# Altium footprint library En.PcbLib: 157 footprints (part 6 of 10)
Each footprint in its own frame and in the unit in brackets; x right, y up, seen from the top. Pads: shape width x height; smd on the part's side, far side on the other; paste and mask are expansions set on the pad; w line width, h text height; cw(c..) or ccw(c..) is an arc to the next point about the centre after c.
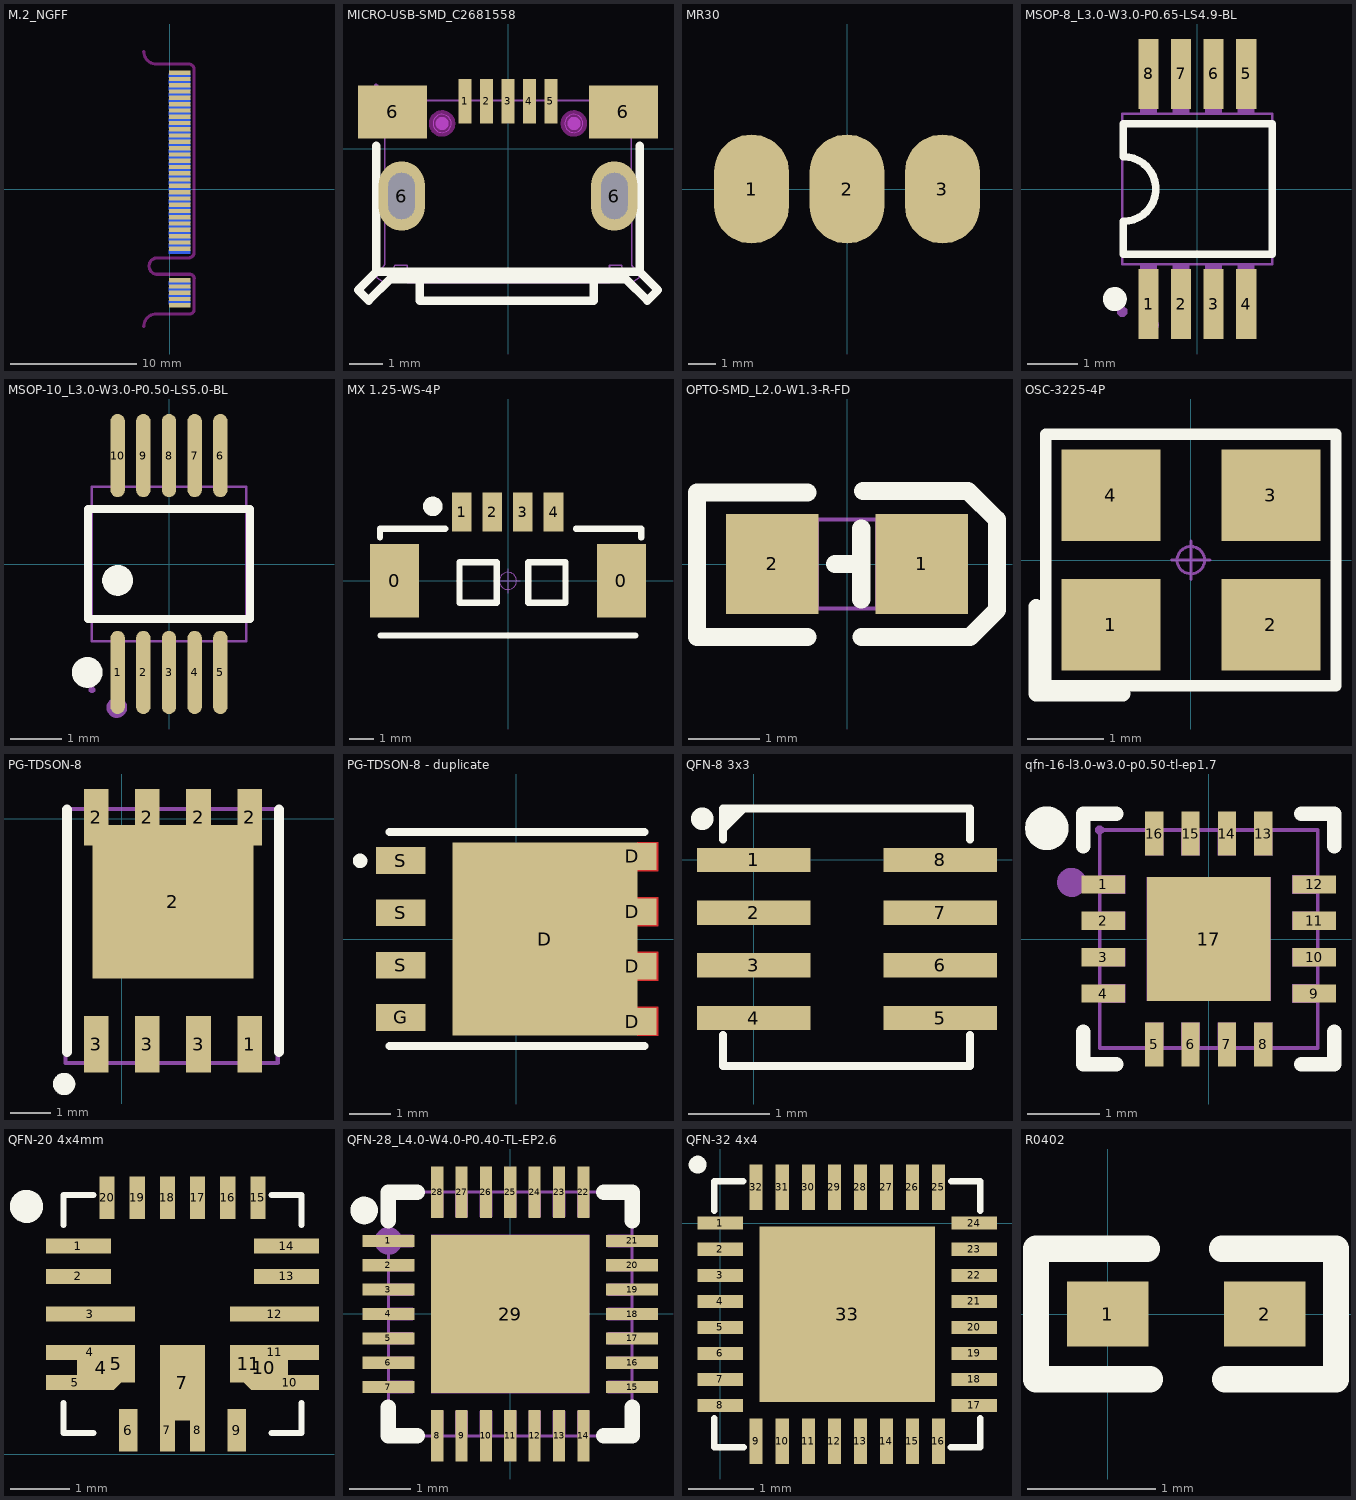
[diagram p5: the footprints below, top view; thin cyan lines are the x and y axes]

## M.2_NGFF [mm]
pads (67):
  rect 1.7x0.34 smd paste+0 mask+0.102: 1(0.787,9.25) 3(0.786,8.75) 5(0.786,8.249) 7(0.786,7.749) 9(0.786,7.249) 11(0.786,6.749) 13(0.786,6.249) 15(0.786,5.749) 17(0.786,5.249) 19(0.786,4.749) 21(0.786,4.249) 23(0.786,3.749) 25(0.786,3.249) 27(0.786,2.749) 29(0.786,2.249) 31(0.786,1.749) 33(0.786,1.249) 35(0.786,0.749) 37(0.786,0.249) 39(0.786,-0.251) 41(0.786,-0.751) 43(0.786,-1.251) 45(0.786,-1.751) 47(0.786,-2.251) 49(0.786,-2.751) 51(0.786,-3.251) 53(0.786,-3.751) 55(0.786,-4.251) 57(0.786,-4.751) 67(0.786,-7.251) 69(0.786,-7.751) 71(0.786,-8.251) 73(0.786,-8.751) 75(0.786,-9.251)
  rect 1.7x0.34 smd far side paste+0 mask+0.102: 2(0.787,9) 4(0.786,8.501) 6(0.786,8.001) 8(0.786,7.501) 10(0.786,7.001) 12(0.786,6.501) 14(0.786,6.001) 16(0.786,5.501) 18(0.786,5.001) 20(0.786,4.499) 22(0.786,4.001) 24(0.786,3.501) 26(0.786,3.001) 28(0.786,2.501) 30(0.786,2.001) 32(0.786,1.501) 34(0.786,1.001) 36(0.786,0.501) 38(0.786,0.001) 40(0.786,-0.499) 42(0.786,-0.998) 44(0.786,-1.499) 46(0.786,-1.999) 48(0.786,-2.499) 50(0.786,-2.999) 52(0.786,-3.499) 54(0.786,-3.999) 56(0.786,-4.499) 58(0.786,-4.999) 68(0.786,-7.499) 70(0.786,-7.999) 72(0.786,-8.499) 74(0.786,-8.999)
Keep-Out Layer:
  lines w0.254: -2.063,-10.93 cw(c-1.063,-10.93) -1.063,-9.93 1.574,-9.935 ccw(c1.589,-9.595) 1.927,-9.555 ; -2.063,10.93 ccw(c-1.063,10.93) -1.063,9.93 1.549,9.94 ; 1.523,9.94 cw(c1.502,9.513) 1.93,9.508 ; 1.584,-6.78 cw(c1.598,-7.12) 1.936,-7.16 1.93,-9.567 ; 1.599,-6.773 -0.963,-6.78 cw(c-0.995,-6.13) -0.963,-5.48 1.523,-5.478 ccw(c1.502,-5.051) 1.93,-5.046 1.93,9.559

## MICRO-USB-SMD_C2681558 [mm]
pads (9):
  rect 0.4x1.35 smd paste-100 mask+0.051: 1(-1.3,1.438) 2(-0.65,1.438) 3(0,1.438) 4(0.65,1.438) 5(1.3,1.438)
  rect 2.1x1.6 smd paste-100 mask+0.051: 6(-3.5,1.113) 6(3.5,1.113)
  oval 1.4x2.1 hole 0.8 slot 1.4 at 90 deg: 6(-3.225,-1.438) 6(3.225,-1.438)
Top Overlay:
  lines w0.254: -4,0.081 -4,-3.737 ; -2.675,-3.962 -2.675,-4.612 2.6,-4.612 2.6,-3.962 ; 4,0.081 4,-3.737 ; -4,-3.737 -4.55,-4.287 -4.225,-4.612 -3.575,-3.962 3.575,-3.962 4.225,-4.612 4.55,-4.287 4,-3.737 ; -4,-3.737 4,-3.737
Top Paste:
  drawing of 9 lines, arcs and shapes, not listed
Keep-Out Layer:
  board cut-out: -1.725,0.763 -1.725,0.817 -1.768,0.917 -1.845,0.994 -1.945,1.036 -2.054,1.036 -2.155,0.994 -2.232,0.918 -2.275,0.817 -2.275,0.763 -2.275,0.708 -2.232,0.608 -2.155,0.531 -2.055,0.49 -1.946,0.489 -1.845,0.531 -1.768,0.608 -1.725,0.708
  board cut-out: 2.275,0.763 2.275,0.817 2.232,0.917 2.155,0.994 2.055,1.036 1.946,1.036 1.845,0.994 1.768,0.918 1.725,0.817 1.725,0.763 1.725,0.708 1.768,0.608 1.845,0.531 1.945,0.49 2.054,0.489 2.155,0.531 2.232,0.608 2.275,0.708
Mechanical 1:
  circle w0.025: c-2,0.763 r0.275
  circle w0.025: c2,0.763 r0.275
Mechanical 6:
  circle w0.2: c-2,0.763 r0.1
  circle w0.2: c2,0.763 r0.1
Mechanical 15:
  region: -3.94,1.913 -3.94,1.937 -3.975,1.973 -4.025,1.973 -4.06,1.937 -4.06,1.913 -4.06,1.888 -4.025,1.853 -3.975,1.853 -3.94,1.888
  region: 1.175,1.913 1.425,1.913 1.425,0.963 1.175,0.963
  region: 0.525,1.913 0.775,1.913 0.775,0.963 0.525,0.963
  region: -0.125,1.913 0.125,1.913 0.125,0.963 -0.125,0.963
  region: -0.775,1.913 -0.525,1.913 -0.525,0.963 -0.775,0.963
  region: -1.425,1.913 -1.175,1.913 -1.175,0.963 -1.425,0.963
  region: 2.74,1.46 3.74,1.46 3.74,0.51 2.74,0.51
  region: -3.75,1.46 -2.75,1.46 -2.75,0.51 -3.75,0.51
  region: 3.45,-0.988 3.45,-1.888 3,-1.888 3,-0.988
  region: -3,-0.988 -3,-1.888 -3.45,-1.888 -3.45,-0.988
  lines w0.051: -4,-3.9 -3.75,-4.07 -3.48,-3.68 -3.44,-3.54 -3.06,-3.54 -3.06,-4.06 3.08,-4.06 3.08,-3.54 3.45,-3.54 3.47,-3.67 3.58,-3.82 3.75,-4.07 4,-3.9 3.75,-3.54 3.74,1.46 -3.74,1.46 -3.74,-3.52 -4,-3.9
Multi-Layer keep-out:
  circle w0.254: c-2,0.763 r0.275
  circle w0.254: c2,0.763 r0.275
3D body "micro 6.4jb.step": height 2.72, standoff -1.21, extent -4,-4.118 4,1.862

## MR30 [mm]
pads (3):
  oval 2.75x4 smd: 1(-3.5,0) 2(0,0) 3(3.5,0)
3D body "mr30-m.step": height 2.45, standoff -2.46, extent -5.95,-1.015 5.95,12.385

## MSOP-8_L3.0-W3.0-P0.65-LS4.9-BL [mil]
pads (8):
  rect 15.98x55 smd: 1(-38.39,-90.55) 2(-12.8,-90.55) 3(12.8,-90.55) 4(38.39,-90.55) 5(38.39,90.55) 6(12.8,90.55) 7(-12.8,90.55) 8(-38.39,90.55)
Top Overlay:
  circle w9.45: c-64.96,-86.61 r4.72
  lines w5.91: -58.2,-51.18 -58.2,-25.5 ccw(c-58.2,0) -58.2,25.5 -58.2,51.18 59.05,51.18 59.05,-51.18 -58.2,-51.18
Mechanical 6:
  circle w7.87: c-38.19,-107.09 r3.94
Mechanical 15:
  region: -55.11,-96.46 -55.11,-94.83 -57.42,-92.52 -60.68,-92.52 -62.99,-94.83 -62.99,-96.46 -62.99,-98.09 -60.68,-100.4 -57.42,-100.4 -55.11,-98.09
  region: 6.4,-71 19.19,-71 19.19,-96.46 6.4,-96.46
  region: 6.42,-58.66 6.42,-72.44 19.17,-72.44 19.17,-58.66
  region: 31.99,-71 44.78,-71 44.78,-96.46 31.99,-96.46
  region: 32.01,-58.66 32.01,-72.44 44.77,-72.44 44.77,-58.66
  region: -19.19,-71 -6.4,-71 -6.4,-96.46 -19.19,-96.46
  region: -19.17,-58.66 -19.17,-72.44 -6.42,-72.44 -6.42,-58.66
  region: -44.78,-71 -31.99,-71 -31.99,-96.46 -44.78,-96.46
  region: -44.76,-58.66 -44.76,-72.44 -32.01,-72.44 -32.01,-58.66
  region: 19.19,71 6.4,71 6.4,96.46 19.19,96.46
  region: 19.18,58.66 19.18,72.44 6.42,72.44 6.42,58.66
  region: 44.78,71 31.99,71 31.99,96.46 44.78,96.46
  region: 44.77,58.66 44.77,72.44 32.01,72.44 32.01,58.66
  region: -6.4,71 -19.2,71 -19.2,96.46 -6.4,96.46
  region: -6.42,58.66 -6.42,72.44 -19.17,72.44 -19.17,58.66
  region: -31.99,71 -44.78,71 -44.78,96.46 -31.99,96.46
  region: -32.01,58.66 -32.01,72.44 -44.76,72.44 -44.76,58.66
  lines w2: -59.05,-59.05 59.05,-59.05 59.05,59.05 -59.05,59.05 -59.05,-59.05
3D body "User Library-MSOP8.SLDPRT": height 42, standoff -1.31, extent -61.02,-97.2 61.02,97.2

## MSOP-10_L3.0-W3.0-P0.50-LS5.0-BL [mm]
pads (10):
  oval 0.28x1.62 smd: 1(-1,-2.11) 2(-0.5,-2.11) 3(0,-2.11) 4(0.5,-2.11) 5(1,-2.11) 6(1,2.11) 7(0.5,2.11) 8(0,2.11) 9(-0.5,2.11) 10(-1,2.11)
Top Overlay:
  circle w0.3: c-1.592,-2.11 r0.15
  circle w0.3: c-1,-0.319 r0.15
  lines w0.152: -1.576,-1.071 1.576,-1.071 1.576,1.071 -1.576,1.071 -1.576,-1.071
Mechanical 6:
  circle w0.2: c-1.016,-2.794 r0.1
Mechanical 15:
  region: 0.888,1.91 0.888,1.49 1.112,1.49 1.112,1.91
  region: 0.888,2.45 0.888,1.9 1.112,1.9 1.112,2.45
  region: 0.388,1.91 0.388,1.49 0.612,1.49 0.612,1.91
  region: 0.388,2.45 0.388,1.9 0.612,1.9 0.612,2.45
  region: -0.112,1.91 -0.112,1.49 0.112,1.49 0.112,1.91
  region: -0.112,2.45 -0.112,1.9 0.112,1.9 0.112,2.45
  region: -0.612,1.91 -0.612,1.49 -0.388,1.49 -0.388,1.91
  region: -0.612,2.45 -0.612,1.9 -0.388,1.9 -0.388,2.45
  region: -1.112,1.91 -1.112,1.49 -0.888,1.49 -0.888,1.91
  region: -1.112,2.45 -1.112,1.9 -0.888,1.9 -0.888,2.45
  region: 0.888,-1.91 0.888,-1.49 1.112,-1.49 1.112,-1.91
  region: 0.888,-2.45 0.888,-1.9 1.112,-1.9 1.112,-2.45
  region: 0.388,-1.91 0.388,-1.49 0.612,-1.49 0.612,-1.91
  region: 0.388,-2.45 0.388,-1.9 0.612,-1.9 0.612,-2.45
  region: -0.112,-1.91 -0.112,-1.49 0.112,-1.49 0.112,-1.91
  region: -0.112,-2.45 -0.112,-1.9 0.112,-1.9 0.112,-2.45
  region: -0.612,-1.91 -0.612,-1.49 -0.388,-1.49 -0.388,-1.91
  region: -0.612,-2.45 -0.612,-1.9 -0.388,-1.9 -0.388,-2.45
  region: -1.112,-1.91 -1.112,-1.49 -0.888,-1.49 -0.888,-1.91
  region: -1.112,-2.45 -1.112,-1.9 -0.888,-1.9 -0.888,-2.45
  region: -1.44,-2.45 -1.44,-2.426 -1.475,-2.391 -1.524,-2.391 -1.559,-2.426 -1.56,-2.45 -1.559,-2.475 -1.524,-2.509 -1.475,-2.509 -1.44,-2.475
  lines w0.051: -1.5,-1.5 1.5,-1.5 1.5,1.5 -1.5,1.5 -1.5,-1.5
3D body "User Library-msop-10.SLDPRT": height 1.15, standoff 0, extent -1.5,-2.45 1.5,2.45

## MX 1.25-WS-4P [mm] "长：10.15mm，宽：4.2mm，高：3.4mm"
height 9.4
pads (6):
  rect 2x3 smd: 0(-4.632,0) 0(4.632,0)
  rect 0.8x1.6 smd: 1(-1.889,2.811) 2(-0.639,2.811) 3(0.611,2.811) 4(1.861,2.811)
Top Overlay:
  circle w0.4: c-3.074,3.048 r0.2
  lines w0.254: -5.233,1.778 -5.233,2.134 -2.566,2.134 ; -5.206,-2.228 5.201,-2.228 ; 2.782,2.134 5.449,2.134 5.449,1.778 ; -1.982,-0.889 -1.982,0.762 -0.458,0.762 -0.458,-0.889 -1.982,-0.889 ; 0.826,-0.889 0.826,0.762 2.35,0.762 2.35,-0.889 0.826,-0.889
Mechanical 15:
  circle w0.05: c0,0 r0.35
  lines w0.05: -0.5,0 0.5,0 ; 0,-0.5 0,0.5
3D body "MOLEX1.25-WS-4P.STEP": height 3.4, standoff 0, extent -5.075,-2.1 5.075,3.09

## OPTO-SMD_L2.0-W1.3-R-FD [mm]
pads (2):
  rect 1.3x1.4 smd: 1(1.05,0) 2(-1.05,0)
Top Overlay:
  lines w0.254: -0.559,-1.029 -2.108,-1.029 -2.108,1.003 -0.559,1.003 ; -0.169,0 0.1,0 ; 0.2,-0.5 0.2,0.5 ; 0.203,-1.029 1.727,-1.029 2.108,-0.648 2.108,0.622 1.702,1.029 0.229,1.029
Mechanical 6:
  region: -1.625,0.652 -0.965,0.652 -0.965,0.412 -1.265,0.412
  region: -1.685,-0.608 -1.025,-0.608 -1.025,-0.368 -1.325,-0.368
  region: 1.135,0.388 0.715,0.388 0.715,-0.392 1.135,-0.392 1.135,-0.272 0.835,-0.272 0.835,-0.032 1.135,-0.032 1.135,0.088 0.835,0.088 0.835,0.268 1.135,0.268
  region: -0.446,0.126 -0.446,0.253 -0.573,0.38 -0.827,0.38 -0.954,0.253 -0.954,-0.255 -0.827,-0.382 -0.573,-0.382 -0.446,-0.255 -0.446,-0.128 -0.573,-0.128 -0.573,-0.255 -0.827,-0.255 -0.827,0.253 -0.573,0.253 -0.573,0.126
Mechanical 15:
  region: -0.4,-0.625 -1,-0.625 -1,0.625 -0.4,0.625
  region: 1,-0.625 0.4,-0.625 0.4,0.625 1,0.625
  region: 1.06,0.625 1.059,0.649 1.024,0.683 0.976,0.683 0.941,0.649 0.94,0.625 0.941,0.601 0.976,0.568 1.024,0.568 1.059,0.601
  lines w0.051: -1,-0.625 -1,0.625 1,0.625 1,-0.625 -1,-0.625
3D body "pt17-21c_l41_tr8.step": height 1, standoff -0.05, extent -1.127,-0.626 0.873,0.625

## OSC-3225-4P [mm] "3.2*2.5*0.7mm(长宽高)                             淘宝ID:黄晶宝石"
pads (4):
  rect 1.3x1.2 smd: 1(-1.05,-0.85) 2(1.05,-0.85) 3(1.05,0.85) 4(-1.05,0.85)
Top Overlay:
  lines w0.15: -1.905,-1.651 -1.905,1.651 1.905,1.651 1.905,-1.651 -1.905,-1.651
  lines w0.2: -2.032,-1.753 -0.889,-1.753 ; -2.032,-1.727 -2.032,-0.61
Mechanical 15:
  circle w0.04: c0,0 r0.18
  lines w0.04: -0.254,0 0.254,0 ; 0,-0.254 0,0.254
3D body "OSC_3225-4.STEP": height 0.7, standoff -0.02, extent -1.6,-1.25 1.6,1.25

## PG-TDSON-8 [mm]
pads (9):
  rect 0.61x1.4 smd: 1(3.175,-5.588) 2(-0.635,0.044) 2(0.635,0.044) 2(1.905,0.044) 2(3.175,0.044) 3(-0.635,-5.588) 3(0.635,-5.588) 3(1.905,-5.588)
  rect 4x3.81 smd: 2(1.27,-2.056)
Top Overlay:
  circle w0.305: c-1.43,-6.572 r0.125
  lines w0.254: -1.36,-5.772 -1.36,0.228 ; 3.9,-5.772 3.9,0.228
Mechanical 13:
  lines w0.1: -1.39,-6.056 3.87,-6.056 3.87,0.244 -1.39,0.244 -1.39,-6.056
3D body "TDSON-8-1.stp": height 1.01, standoff 0, extent -1.425,-5.726 3.965,0.424

## PG-TDSON-8 - duplicate [mm]
pads (9):
  rect 4.5x4.7 smd: D(0.691,0)
  rect 1.2x0.65 smd: D(2.81,-2.007) D(2.81,-0.66) D(2.81,0.66) D(2.81,2.007) G(-2.809,-1.905) S(-2.809,-0.635) S(-2.809,0.635) S(-2.809,1.905)
Top Layer:
  region: 2.941,2.35 2.941,1.65 3.441,1.65 3.441,2.35
  region: 2.941,-1.65 2.941,-2.35 3.441,-2.35 3.441,-1.65
  region: 2.941,1.015 2.941,0.315 3.441,0.315 3.441,1.015
  region: 2.941,-0.315 2.941,-1.015 3.441,-1.015 3.441,-0.315
Top Overlay:
  circle w0.25: c-3.8,1.9 r0.05
  lines w0.2: -3.084,-2.6 3.116,-2.6 ; -3.084,2.6 3.116,2.6
3D body "TDSON-8-1.stp": height 1.01, standoff 0, extent -3.059,-2.695 3.091,2.695

## QFN-8 3x3 [mm]
pads (8):
  rect 1.4x0.3 smd: 1(0,0) 2(0,-0.65) 3(0,-1.3) 4(0,-1.95) 5(2.3,-1.95) 6(2.3,-1.3) 7(2.3,-0.65) 8(2.3,0)
Top Overlay:
  circle w0.254: c-0.635,0.508 r0.01
  lines w0.1: -0.381,-2.159 -0.381,-2.54 2.667,-2.54 2.667,-2.159 ; -0.381,0.254 -0.381,0.635 2.667,0.635 2.667,0.254 ; -0.381,0.381 -0.127,0.635 ; -0.381,0.508 -0.254,0.635
3D body "QFN-3x3_MP4423A_MNP.step": height 0.94, standoff 0, extent -0.406,-2.529 2.692,0.569

## qfn-16-l3.0-w3.0-p0.50-tl-ep1.7 [mm]
pads (17):
  rect 0.6x0.25 smd: 1(-1.45,0.75) 2(-1.45,0.25) 3(-1.45,-0.25) 4(-1.45,-0.75) 9(1.45,-0.75) 10(1.45,-0.25) 11(1.45,0.25) 12(1.45,0.75)
  rect 0.25x0.6 smd: 5(-0.75,-1.45) 6(-0.25,-1.45) 7(0.25,-1.45) 8(0.75,-1.45) 13(0.75,1.45) 14(0.25,1.45) 15(-0.25,1.45) 16(-0.75,1.45)
  rect 1.7x1.7 smd: 17(0,0)
Top Overlay:
  lines w0.2: -1.725,-1.275 -1.725,-1.725 -1.275,-1.725 ; -1.725,1.275 -1.725,1.725 -1.275,1.725 ; 1.275,-1.725 1.725,-1.725 1.725,-1.275 ; 1.275,1.725 1.725,1.725 1.725,1.275
  lines w0.3: -2.075,1.521 cw(c-2.225,1.523) -2.375,1.523 cw(c-2.225,1.523) -2.075,1.524
Mechanical 6:
  circle w0.2: c-1.885,0.778 r0.1
Mechanical 15:
  region: -1.491,0.625 -1.491,0.875 -1.151,0.875 -1.151,0.625
  region: -1.491,0.125 -1.491,0.375 -1.151,0.375 -1.151,0.125
  region: -1.491,-0.375 -1.491,-0.125 -1.151,-0.125 -1.151,-0.375
  region: -1.491,-0.875 -1.491,-0.625 -1.151,-0.625 -1.151,-0.875
  region: -0.625,-1.491 -0.875,-1.491 -0.875,-1.151 -0.625,-1.151
  region: -0.125,-1.491 -0.375,-1.491 -0.375,-1.151 -0.125,-1.151
  region: 0.375,-1.491 0.125,-1.491 0.125,-1.151 0.375,-1.151
  region: 0.875,-1.491 0.625,-1.491 0.625,-1.151 0.875,-1.151
  region: 1.491,-0.625 1.491,-0.875 1.151,-0.875 1.151,-0.625
  region: 1.491,-0.125 1.491,-0.375 1.151,-0.375 1.151,-0.125
  region: 1.491,0.375 1.491,0.125 1.151,0.125 1.151,0.375
  region: 1.491,0.875 1.491,0.625 1.151,0.625 1.151,0.875
  region: 0.625,1.491 0.875,1.491 0.875,1.151 0.625,1.151
  region: 0.125,1.491 0.375,1.491 0.375,1.151 0.125,1.151
  region: -0.375,1.491 -0.125,1.491 -0.125,1.151 -0.375,1.151
  region: -0.85,0.85 0.85,0.85 0.85,-0.85 -0.85,-0.85
  region: -0.875,1.491 -0.625,1.491 -0.625,1.151 -0.875,1.151
  region: -1.439,1.5 -1.44,1.525 -1.475,1.559 -1.524,1.559 -1.559,1.525 -1.559,1.5 -1.559,1.475 -1.524,1.44 -1.475,1.44 -1.44,1.475
  lines w0.051: -1.5,-1.5 -1.5,1.5 1.5,1.5 1.5,-1.5 -1.5,-1.5
3D body "QFN-16_MA600_MNP.step": height 0.94, standoff 0, extent -1.549,-1.549 1.549,1.549

## QFN-20 4x4mm [mil]
pads (25):
  rect 43x10 smd: 1(51,138) 2(51,118) 13(189,118) 14(189,138)
  rect 59x10 smd: 3(59,93) 4(59,67.5) 11(181,67.5) 12(181,93)
  oct 32x30 smd: 4(66,57.5) 10(174,57.5)
  rect 39x10 smd: 5(49,47.5) 10(191,47.5)
  rect 25x25 smd: 5(76,60) 11(164,60)
  rect 12x28 smd: 6(84,16) 9(156,16)
  rect 10x28 smd: 7(110,16) 8(130,16) 15(170,170) 16(150,170) 17(130,170) 18(110,170) 19(90,170) 20(70,170)
  rect 30x50 smd: 7(120,47.5)
Top Overlay:
  circle w12: c16.6,164.3 r5
  lines w4: 41,34 41,14 61,14 ; 41,152 41,172 61,172 ; 179,14 199,14 199,34 ; 179,172 199,172 199,152
3D body "MP4312GRE.step": height 33.53, standoff 0.06, extent 40.79,14.67 198.27,172.15

## QFN-28_L4.0-W4.0-P0.40-TL-EP2.6 [mm]
pads (29):
  rect 0.85x0.2 smd paste+0 mask+0.05: 1(-2,1.2) 2(-2,0.8) 3(-2,0.4) 4(-2,0.001) 5(-2,-0.4) 6(-2,-0.8) 7(-2,-1.2) 15(2,-1.2) 16(2,-0.8) 17(2,-0.4) 18(2,0) 19(2,0.4) 20(2,0.8) 21(2,1.2)
  rect 0.2x0.85 smd paste+0 mask+0.05: 8(-1.2,-2) 9(-0.8,-2) 10(-0.4,-2) 11(0,-2) 12(0.4,-2) 13(0.8,-2) 14(1.2,-2) 22(1.2,2) 23(0.8,2) 24(0.4,2) 25(0,2) 26(-0.4,2) 27(-0.8,2) 28(-1.2,2)
  rect 2.6x2.6 smd paste+0 mask+0.05: 29(0,0)
Top Overlay:
  circle w0.254: c-2.4,1.7 r0.1
  lines w0.254: -2,-1.531 -2,-2 -1.531,-2 ; -2,1.531 -2,2 -1.531,2 ; 1.531,-2 2,-2 2,-1.531 ; 1.531,2 2,2 2,1.531
Mechanical 6:
  circle w0.254: c-2,1.2 r0.1
Mechanical 15:
  drawing of 34 lines, arcs and shapes, not listed
3D body "mp6531agr-z.step": height 0.5, standoff 0, extent -2,-2 2,2

## QFN-32 4x4 [mm]
pads (33):
  rect 0.7x0.2 smd mask+0.05: 1(0,0) 2(0,-0.4) 3(0,-0.8) 4(0,-1.2) 5(0,-1.6) 6(0,-2) 7(0,-2.4) 8(0,-2.8) 17(3.9,-2.8) 18(3.9,-2.4) 19(3.9,-2) 20(3.9,-1.6) 21(3.9,-1.2) 22(3.9,-0.8) 23(3.9,-0.4) 24(3.9,0)
  rect 0.2x0.7 smd mask+0.05: 9(0.55,-3.35) 10(0.95,-3.35) 11(1.35,-3.35) 12(1.75,-3.35) 13(2.15,-3.35) 14(2.55,-3.35) 15(2.95,-3.35) 16(3.35,-3.35) 25(3.35,0.55) 26(2.95,0.55) 27(2.55,0.55) 28(2.15,0.55) 29(1.75,0.55) 30(1.35,0.55) 31(0.95,0.55) 32(0.55,0.55)
  rect 2.7x2.7 smd mask+0.05: 33(1.95,-1.4)
Top Overlay:
  circle w0.254: c-0.35,0.9 r0.01
  lines w0.1: -0.095,-2.995 -0.095,-3.442 0.358,-3.442 ; -0.095,0.195 -0.095,0.648 0.352,0.648 ; 3.542,-3.442 3.995,-3.442 3.995,-2.995 ; 3.55,0.648 3.995,0.648 3.995,0.195
3D body "QFN-32_MP2980_MNP.step": height 0.94, standoff 0, extent -0.095,-3.442 3.995,0.648

## R0402 [mil] "1/16W"
pads (2):
  rect 25x20 smd: 1(0,0) 2(48.2,0)
Top Overlay:
  lines w8: 12,20 -22,20 -22,-20 13,-20 ; 35,20 70,20 70,-20 36,-20
3D body "R0402.STEP": height 13.78, standoff 0, extent 4.71,-9.79 44.09,9.9